# Altium footprint library Connector_Samtec_HLE_SMD.PcbLib: 290 footprints (part 23 of 24)
Each footprint in its own frame and in the unit in brackets; x right, y up, seen from the top. Pads: shape width x height; smd on the part's side, far side on the other; paste and mask are expansions set on the pad; w line width, h text height; cw(c..) or ccw(c..) is an arc to the next point about the centre after c.
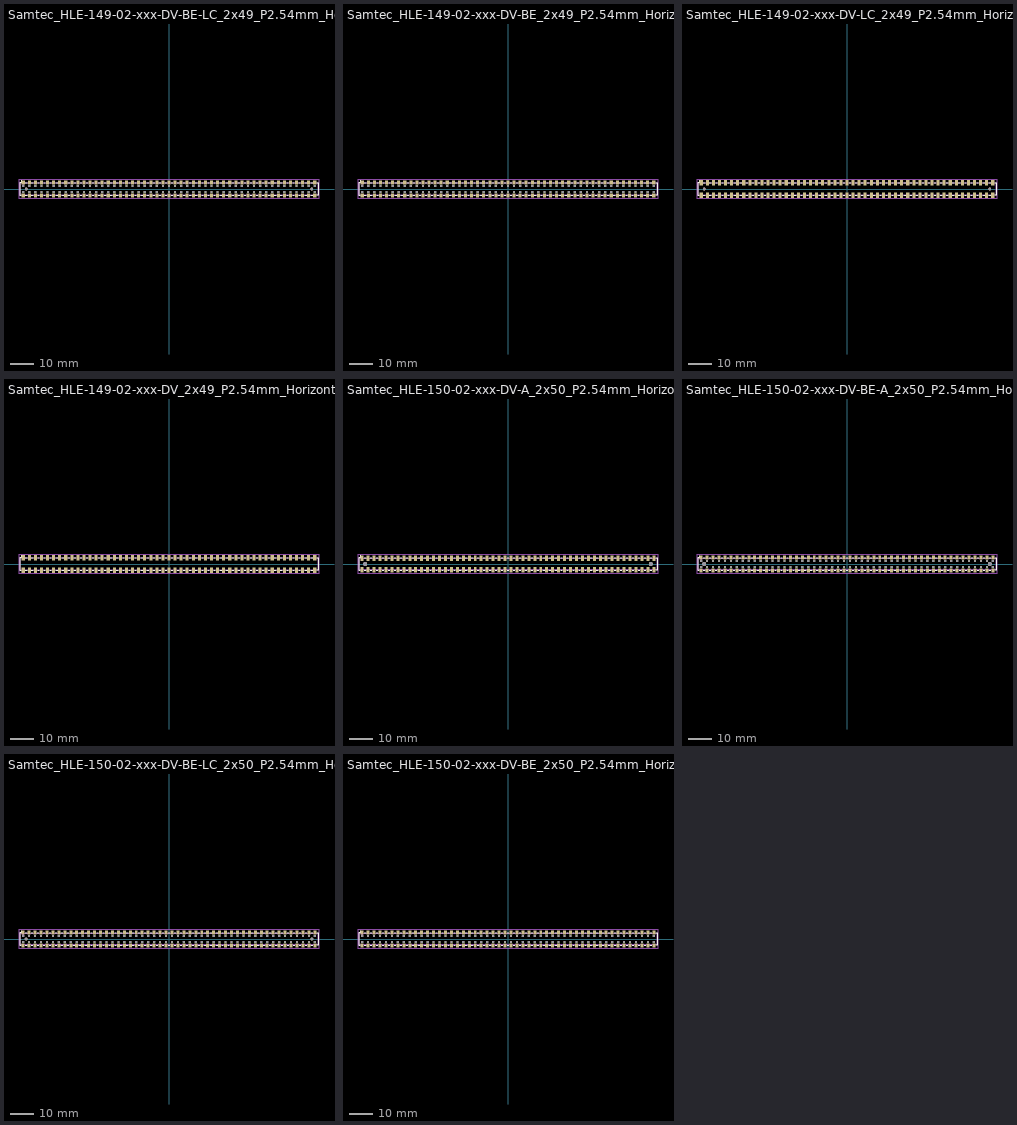
[diagram p22: the footprints below, top view; thin cyan lines are the x and y axes]

## Samtec_HLE-149-02-xxx-DV-BE-LC_2x49_P2.54mm_Horizontal [mm]
pads (198):
  rect 1.27x1.68 smd: 1(-60.96,2.72) 2(-60.96,-2.72) 3(-58.42,2.72) 4(-58.42,-2.72) 5(-55.88,2.72) 6(-55.88,-2.72) 7(-53.34,2.72) 8(-53.34,-2.72) 9(-50.8,2.72) 10(-50.8,-2.72) 11(-48.26,2.72) 12(-48.26,-2.72) 13(-45.72,2.72) 14(-45.72,-2.72) 15(-43.18,2.72) 16(-43.18,-2.72) 17(-40.64,2.72) 18(-40.64,-2.72) 19(-38.1,2.72) 20(-38.1,-2.72) 21(-35.56,2.72) 22(-35.56,-2.72) 23(-33.02,2.72) 24(-33.02,-2.72) 25(-30.48,2.72) 26(-30.48,-2.72) 27(-27.94,2.72) 28(-27.94,-2.72) 29(-25.4,2.72) 30(-25.4,-2.72) 31(-22.86,2.72) 32(-22.86,-2.72) 33(-20.32,2.72) 34(-20.32,-2.72) 35(-17.78,2.72) 36(-17.78,-2.72) 37(-15.24,2.72) 38(-15.24,-2.72) 39(-12.7,2.72) 40(-12.7,-2.72) 41(-10.16,2.72) 42(-10.16,-2.72) 43(-7.62,2.72) 44(-7.62,-2.72) 45(-5.08,2.72) 46(-5.08,-2.72) 47(-2.54,2.72) 48(-2.54,-2.72) 49(0,2.72) 50(0,-2.72) 51(2.54,2.72) 52(2.54,-2.72) 53(5.08,2.72) 54(5.08,-2.72) 55(7.62,2.72) 56(7.62,-2.72) 57(10.16,2.72) 58(10.16,-2.72) 59(12.7,2.72) 60(12.7,-2.72) 61(15.24,2.72) 62(15.24,-2.72) 63(17.78,2.72) 64(17.78,-2.72) 65(20.32,2.72) 66(20.32,-2.72) 67(22.86,2.72) 68(22.86,-2.72) 69(25.4,2.72) 70(25.4,-2.72) 71(27.94,2.72) 72(27.94,-2.72) 73(30.48,2.72) 74(30.48,-2.72) 75(33.02,2.72) 76(33.02,-2.72) 77(35.56,2.72) 78(35.56,-2.72) 79(38.1,2.72) 80(38.1,-2.72) 81(40.64,2.72) 82(40.64,-2.72) 83(43.18,2.72) 84(43.18,-2.72) 85(45.72,2.72) 86(45.72,-2.72) 87(48.26,2.72) 88(48.26,-2.72) 89(50.8,2.72) 90(50.8,-2.72) 91(53.34,2.72) 92(53.34,-2.72) 93(55.88,2.72) 94(55.88,-2.72) 95(58.42,2.72) 96(58.42,-2.72) 97(60.96,2.72) 98(60.96,-2.72)
  round 0.97 hole 0.97: Un1(0,1.27) Un2(17.78,-1.27) Un3(22.86,-1.27) Un4(-25.4,1.27) Un5(35.56,-1.27) Un6(-38.1,-1.27) Un7(-17.78,1.27) Un8(-35.56,1.27) Un9(38.1,1.27) Un10(40.64,1.27) Un11(30.48,-1.27) Un12(-15.24,-1.27) Un13(5.08,-1.27) Un14(10.16,1.27) Un15(7.62,1.27) Un16(-60.96,-1.27) Un17(-20.32,1.27) Un18(-10.16,-1.27) Un19(43.18,1.27) Un20(-10.16,1.27) Un21(45.72,-1.27) Un22(-45.72,-1.27) Un23(-40.64,-1.27) Un24(50.8,-1.27) Un25(-43.18,-1.27) Un26(-53.34,1.27) Un27(22.86,1.27) Un28(-7.62,1.27) Un29(58.42,1.27) Un30(-58.42,-1.27) Un31(-2.54,1.27) Un32(40.64,-1.27) Un33(-7.62,-1.27) Un34(-33.02,1.27) Un35(60.96,-1.27) Un36(-5.08,-1.27) Un37(-2.54,-1.27) Un38(-50.8,1.27) Un39(7.62,-1.27) Un40(-50.8,-1.27) Un41(-12.7,-1.27) Un42(-53.34,-1.27) Un43(33.02,-1.27) Un44(-55.88,-1.27) Un45(-55.88,1.27) Un46(-17.78,-1.27) Un47(-43.18,1.27) Un48(-22.86,-1.27) Un49(-20.32,-1.27) Un50(-40.64,1.27) Un51(53.34,-1.27) Un52(30.48,1.27) Un53(5.08,1.27) Un54(-45.72,1.27) Un55(20.32,1.27) Un56(0,-1.27) Un57(58.42,-1.27) Un58(-60.96,1.27) Un59(48.26,1.27) Un60(-30.48,-1.27) Un61(55.88,1.27) Un62(2.54,1.27) Un63(-48.26,1.27) Un64(2.54,-1.27) Un65(60.96,1.27) Un66(50.8,1.27) Un67(35.56,1.27) Un68(-58.42,1.27) Un69(17.78,1.27) Un70(55.88,-1.27) Un71(-38.1,1.27) Un72(-22.86,1.27) Un73(53.34,1.27) Un74(15.24,-1.27) Un76(15.24,1.27) Un78(-30.48,1.27) Un79(10.16,-1.27) Un80(27.94,1.27) Un81(20.32,-1.27) Un82(-33.02,-1.27) Un83(-27.94,1.27) Un84(43.18,-1.27) Un85(-48.26,-1.27) Un86(45.72,1.27) Un87(12.7,-1.27) Un88(-15.24,1.27) Un89(-25.4,-1.27) Un90(48.26,-1.27) Un91(-12.7,1.27) Un92(12.7,1.27) Un93(-35.56,-1.27) Un94(25.4,1.27) Un95(27.94,-1.27) Un96(25.4,-1.27) Un97(38.1,-1.27) Un98(-27.94,-1.27) Un99(-5.08,1.27) Un100(33.02,1.27)
  round 1.19 hole 1.19: Un75(-59.69,0) Un77(59.69,0)
F.SilkS:
  lines w0.12: -61.855,-2.65 -62.34,-2.65 -62.34,2.65 -61.855,2.65 -61.855,3.56 ; -60.065,-2.65 -59.315,-2.65 ; -60.065,2.65 -59.315,2.65 ; -57.525,-2.65 -56.775,-2.65 ; -57.525,2.65 -56.775,2.65 ; -54.985,-2.65 -54.235,-2.65 ; -54.985,2.65 -54.235,2.65 ; -52.445,-2.65 -51.695,-2.65 ; -52.445,2.65 -51.695,2.65 ; -49.905,-2.65 -49.155,-2.65 ; -49.905,2.65 -49.155,2.65 ; -47.365,-2.65 -46.615,-2.65 ; -47.365,2.65 -46.615,2.65 ; -44.825,-2.65 -44.075,-2.65 ; -44.825,2.65 -44.075,2.65 ; -42.285,-2.65 -41.535,-2.65 ; -42.285,2.65 -41.535,2.65 ; -39.745,-2.65 -38.995,-2.65 ; -39.745,2.65 -38.995,2.65 ; -37.205,-2.65 -36.455,-2.65 ; -37.205,2.65 -36.455,2.65 ; -34.665,-2.65 -33.915,-2.65 ; -34.665,2.65 -33.915,2.65 ; -32.125,-2.65 -31.375,-2.65 ; -32.125,2.65 -31.375,2.65 ; -29.585,-2.65 -28.835,-2.65 ; -29.585,2.65 -28.835,2.65 ; -27.045,-2.65 -26.295,-2.65 ; -27.045,2.65 -26.295,2.65 ; -24.505,-2.65 -23.755,-2.65 ; -24.505,2.65 -23.755,2.65 ; -21.965,-2.65 -21.215,-2.65 ; -21.965,2.65 -21.215,2.65 ; -19.425,-2.65 -18.675,-2.65 ; -19.425,2.65 -18.675,2.65 ; -16.885,-2.65 -16.135,-2.65 ; -16.885,2.65 -16.135,2.65 ; -14.345,-2.65 -13.595,-2.65 ; -14.345,2.65 -13.595,2.65 ; -11.805,-2.65 -11.055,-2.65 ; -11.805,2.65 -11.055,2.65 ; -9.265,-2.65 -8.515,-2.65 ; -9.265,2.65 -8.515,2.65 ; -6.725,-2.65 -5.975,-2.65 ; -6.725,2.65 -5.975,2.65 ; -4.185,-2.65 -3.435,-2.65 ; -4.185,2.65 -3.435,2.65 ; -1.645,-2.65 -0.895,-2.65 ; -1.645,2.65 -0.895,2.65 ; 0.895,-2.65 1.645,-2.65 ; 0.895,2.65 1.645,2.65 ; 3.435,-2.65 4.185,-2.65 ; 3.435,2.65 4.185,2.65 ; 5.975,-2.65 6.725,-2.65 ; 5.975,2.65 6.725,2.65 ; 8.515,-2.65 9.265,-2.65 ; 8.515,2.65 9.265,2.65 ; 11.055,-2.65 11.805,-2.65 ; 11.055,2.65 11.805,2.65 ; 13.595,-2.65 14.345,-2.65 ; 13.595,2.65 14.345,2.65 ; 16.135,-2.65 16.885,-2.65 ; 16.135,2.65 16.885,2.65 ; 18.675,-2.65 19.425,-2.65 ; 18.675,2.65 19.425,2.65 ; 21.215,-2.65 21.965,-2.65 ; 21.215,2.65 21.965,2.65 ; 23.755,-2.65 24.505,-2.65 ; 23.755,2.65 24.505,2.65 ; 26.295,-2.65 27.045,-2.65 ; 26.295,2.65 27.045,2.65 ; 28.835,-2.65 29.585,-2.65 ; 28.835,2.65 29.585,2.65 ; 31.375,-2.65 32.125,-2.65 ; 31.375,2.65 32.125,2.65 ; 33.915,-2.65 34.665,-2.65 ; 33.915,2.65 34.665,2.65 ; 36.455,-2.65 37.205,-2.65 ; 36.455,2.65 37.205,2.65 ; 38.995,-2.65 39.745,-2.65 ; 38.995,2.65 39.745,2.65 ; 41.535,-2.65 42.285,-2.65 ; 41.535,2.65 42.285,2.65 ; 44.075,-2.65 44.825,-2.65 ; 44.075,2.65 44.825,2.65 ; 46.615,-2.65 47.365,-2.65 ; 46.615,2.65 47.365,2.65 ; 49.155,-2.65 49.905,-2.65 ; 49.155,2.65 49.905,2.65 ; 51.695,-2.65 52.445,-2.65 ; 51.695,2.65 52.445,2.65 ; 54.235,-2.65 54.985,-2.65 ; 54.235,2.65 54.985,2.65 ; 56.775,-2.65 57.525,-2.65 ; 56.775,2.65 57.525,2.65 ; 59.315,-2.65 60.065,-2.65 ; 59.315,2.65 60.065,2.65 ; 61.855,-2.65 62.34,-2.65 62.34,2.65 61.855,2.65
F.CrtYd:
  lines w0.05: -62.73,-4.06 -62.73,4.06 62.73,4.06 62.73,-4.06 -62.73,-4.06
F.Fab:
  lines w0.1: -61.46,2.54 -60.96,1.833 -60.46,2.54 ; -62.23,-2.54 -62.23,2.54 62.23,2.54 62.23,-2.54 -62.23,-2.54
  text "'.Designator'" at -4.047,-2.68 h1

## Samtec_HLE-149-02-xxx-DV-BE_2x49_P2.54mm_Horizontal [mm]
pads (196):
  rect 1.27x1.68 smd: 1(-60.96,2.72) 2(-60.96,-2.72) 3(-58.42,2.72) 4(-58.42,-2.72) 5(-55.88,2.72) 6(-55.88,-2.72) 7(-53.34,2.72) 8(-53.34,-2.72) 9(-50.8,2.72) 10(-50.8,-2.72) 11(-48.26,2.72) 12(-48.26,-2.72) 13(-45.72,2.72) 14(-45.72,-2.72) 15(-43.18,2.72) 16(-43.18,-2.72) 17(-40.64,2.72) 18(-40.64,-2.72) 19(-38.1,2.72) 20(-38.1,-2.72) 21(-35.56,2.72) 22(-35.56,-2.72) 23(-33.02,2.72) 24(-33.02,-2.72) 25(-30.48,2.72) 26(-30.48,-2.72) 27(-27.94,2.72) 28(-27.94,-2.72) 29(-25.4,2.72) 30(-25.4,-2.72) 31(-22.86,2.72) 32(-22.86,-2.72) 33(-20.32,2.72) 34(-20.32,-2.72) 35(-17.78,2.72) 36(-17.78,-2.72) 37(-15.24,2.72) 38(-15.24,-2.72) 39(-12.7,2.72) 40(-12.7,-2.72) 41(-10.16,2.72) 42(-10.16,-2.72) 43(-7.62,2.72) 44(-7.62,-2.72) 45(-5.08,2.72) 46(-5.08,-2.72) 47(-2.54,2.72) 48(-2.54,-2.72) 49(0,2.72) 50(0,-2.72) 51(2.54,2.72) 52(2.54,-2.72) 53(5.08,2.72) 54(5.08,-2.72) 55(7.62,2.72) 56(7.62,-2.72) 57(10.16,2.72) 58(10.16,-2.72) 59(12.7,2.72) 60(12.7,-2.72) 61(15.24,2.72) 62(15.24,-2.72) 63(17.78,2.72) 64(17.78,-2.72) 65(20.32,2.72) 66(20.32,-2.72) 67(22.86,2.72) 68(22.86,-2.72) 69(25.4,2.72) 70(25.4,-2.72) 71(27.94,2.72) 72(27.94,-2.72) 73(30.48,2.72) 74(30.48,-2.72) 75(33.02,2.72) 76(33.02,-2.72) 77(35.56,2.72) 78(35.56,-2.72) 79(38.1,2.72) 80(38.1,-2.72) 81(40.64,2.72) 82(40.64,-2.72) 83(43.18,2.72) 84(43.18,-2.72) 85(45.72,2.72) 86(45.72,-2.72) 87(48.26,2.72) 88(48.26,-2.72) 89(50.8,2.72) 90(50.8,-2.72) 91(53.34,2.72) 92(53.34,-2.72) 93(55.88,2.72) 94(55.88,-2.72) 95(58.42,2.72) 96(58.42,-2.72) 97(60.96,2.72) 98(60.96,-2.72)
  round 0.97 hole 0.97: Un1(12.7,1.27) Un2(0,-1.27) Un3(22.86,-1.27) Un4(-38.1,-1.27) Un5(7.62,-1.27) Un6(-60.96,1.27) Un7(27.94,1.27) Un8(-30.48,1.27) Un9(-53.34,-1.27) Un10(-55.88,-1.27) Un11(55.88,-1.27) Un12(45.72,1.27) Un13(-43.18,-1.27) Un14(-33.02,1.27) Un15(38.1,-1.27) Un16(15.24,1.27) Un17(43.18,-1.27) Un18(-60.96,-1.27) Un19(58.42,1.27) Un20(-17.78,-1.27) Un21(-40.64,1.27) Un22(48.26,-1.27) Un23(17.78,-1.27) Un24(27.94,-1.27) Un25(-17.78,1.27) Un26(-22.86,1.27) Un27(-27.94,-1.27) Un28(40.64,-1.27) Un29(33.02,1.27) Un30(-7.62,-1.27) Un31(10.16,1.27) Un32(45.72,-1.27) Un33(58.42,-1.27) Un34(-10.16,-1.27) Un35(60.96,1.27) Un36(40.64,1.27) Un37(-25.4,1.27) Un38(15.24,-1.27) Un39(-15.24,-1.27) Un40(25.4,1.27) Un41(-5.08,1.27) Un42(-7.62,1.27) Un43(5.08,-1.27) Un44(17.78,1.27) Un45(43.18,1.27) Un46(30.48,-1.27) Un47(-2.54,1.27) Un48(-43.18,1.27) Un49(12.7,-1.27) Un50(55.88,1.27) Un51(2.54,1.27) Un52(-2.54,-1.27) Un53(53.34,-1.27) Un54(-20.32,1.27) Un55(-38.1,1.27) Un56(50.8,-1.27) Un57(-20.32,-1.27) Un58(-35.56,1.27) Un59(-58.42,1.27) Un60(-55.88,1.27) Un61(-15.24,1.27) Un62(53.34,1.27) Un63(2.54,-1.27) Un64(-22.86,-1.27) Un65(-27.94,1.27) Un66(38.1,1.27) Un67(33.02,-1.27) Un68(-45.72,1.27) Un69(-40.64,-1.27) Un70(-30.48,-1.27) Un71(-48.26,1.27) Un72(-45.72,-1.27) Un73(20.32,-1.27) Un74(35.56,1.27) Un75(5.08,1.27) Un76(22.86,1.27) Un77(0,1.27) Un78(-58.42,-1.27) Un79(-48.26,-1.27) Un80(60.96,-1.27) Un81(50.8,1.27) Un82(-50.8,1.27) Un83(30.48,1.27) Un84(-5.08,-1.27) Un85(-50.8,-1.27) Un86(48.26,1.27) Un87(-35.56,-1.27) Un88(-33.02,-1.27) Un89(20.32,1.27) Un90(7.62,1.27) Un91(10.16,-1.27) Un92(-10.16,1.27) Un93(-53.34,1.27) Un94(25.4,-1.27) Un95(35.56,-1.27) Un96(-12.7,1.27) Un97(-12.7,-1.27) Un98(-25.4,-1.27)
F.SilkS:
  lines w0.12: -61.855,-2.65 -62.34,-2.65 -62.34,2.65 -61.855,2.65 -61.855,3.56 ; -60.065,-2.65 -59.315,-2.65 ; -60.065,2.65 -59.315,2.65 ; -57.525,-2.65 -56.775,-2.65 ; -57.525,2.65 -56.775,2.65 ; -54.985,-2.65 -54.235,-2.65 ; -54.985,2.65 -54.235,2.65 ; -52.445,-2.65 -51.695,-2.65 ; -52.445,2.65 -51.695,2.65 ; -49.905,-2.65 -49.155,-2.65 ; -49.905,2.65 -49.155,2.65 ; -47.365,-2.65 -46.615,-2.65 ; -47.365,2.65 -46.615,2.65 ; -44.825,-2.65 -44.075,-2.65 ; -44.825,2.65 -44.075,2.65 ; -42.285,-2.65 -41.535,-2.65 ; -42.285,2.65 -41.535,2.65 ; -39.745,-2.65 -38.995,-2.65 ; -39.745,2.65 -38.995,2.65 ; -37.205,-2.65 -36.455,-2.65 ; -37.205,2.65 -36.455,2.65 ; -34.665,-2.65 -33.915,-2.65 ; -34.665,2.65 -33.915,2.65 ; -32.125,-2.65 -31.375,-2.65 ; -32.125,2.65 -31.375,2.65 ; -29.585,-2.65 -28.835,-2.65 ; -29.585,2.65 -28.835,2.65 ; -27.045,-2.65 -26.295,-2.65 ; -27.045,2.65 -26.295,2.65 ; -24.505,-2.65 -23.755,-2.65 ; -24.505,2.65 -23.755,2.65 ; -21.965,-2.65 -21.215,-2.65 ; -21.965,2.65 -21.215,2.65 ; -19.425,-2.65 -18.675,-2.65 ; -19.425,2.65 -18.675,2.65 ; -16.885,-2.65 -16.135,-2.65 ; -16.885,2.65 -16.135,2.65 ; -14.345,-2.65 -13.595,-2.65 ; -14.345,2.65 -13.595,2.65 ; -11.805,-2.65 -11.055,-2.65 ; -11.805,2.65 -11.055,2.65 ; -9.265,-2.65 -8.515,-2.65 ; -9.265,2.65 -8.515,2.65 ; -6.725,-2.65 -5.975,-2.65 ; -6.725,2.65 -5.975,2.65 ; -4.185,-2.65 -3.435,-2.65 ; -4.185,2.65 -3.435,2.65 ; -1.645,-2.65 -0.895,-2.65 ; -1.645,2.65 -0.895,2.65 ; 0.895,-2.65 1.645,-2.65 ; 0.895,2.65 1.645,2.65 ; 3.435,-2.65 4.185,-2.65 ; 3.435,2.65 4.185,2.65 ; 5.975,-2.65 6.725,-2.65 ; 5.975,2.65 6.725,2.65 ; 8.515,-2.65 9.265,-2.65 ; 8.515,2.65 9.265,2.65 ; 11.055,-2.65 11.805,-2.65 ; 11.055,2.65 11.805,2.65 ; 13.595,-2.65 14.345,-2.65 ; 13.595,2.65 14.345,2.65 ; 16.135,-2.65 16.885,-2.65 ; 16.135,2.65 16.885,2.65 ; 18.675,-2.65 19.425,-2.65 ; 18.675,2.65 19.425,2.65 ; 21.215,-2.65 21.965,-2.65 ; 21.215,2.65 21.965,2.65 ; 23.755,-2.65 24.505,-2.65 ; 23.755,2.65 24.505,2.65 ; 26.295,-2.65 27.045,-2.65 ; 26.295,2.65 27.045,2.65 ; 28.835,-2.65 29.585,-2.65 ; 28.835,2.65 29.585,2.65 ; 31.375,-2.65 32.125,-2.65 ; 31.375,2.65 32.125,2.65 ; 33.915,-2.65 34.665,-2.65 ; 33.915,2.65 34.665,2.65 ; 36.455,-2.65 37.205,-2.65 ; 36.455,2.65 37.205,2.65 ; 38.995,-2.65 39.745,-2.65 ; 38.995,2.65 39.745,2.65 ; 41.535,-2.65 42.285,-2.65 ; 41.535,2.65 42.285,2.65 ; 44.075,-2.65 44.825,-2.65 ; 44.075,2.65 44.825,2.65 ; 46.615,-2.65 47.365,-2.65 ; 46.615,2.65 47.365,2.65 ; 49.155,-2.65 49.905,-2.65 ; 49.155,2.65 49.905,2.65 ; 51.695,-2.65 52.445,-2.65 ; 51.695,2.65 52.445,2.65 ; 54.235,-2.65 54.985,-2.65 ; 54.235,2.65 54.985,2.65 ; 56.775,-2.65 57.525,-2.65 ; 56.775,2.65 57.525,2.65 ; 59.315,-2.65 60.065,-2.65 ; 59.315,2.65 60.065,2.65 ; 61.855,-2.65 62.34,-2.65 62.34,2.65 61.855,2.65
F.CrtYd:
  lines w0.05: -62.73,-4.06 -62.73,4.06 62.73,4.06 62.73,-4.06 -62.73,-4.06
F.Fab:
  lines w0.1: -61.46,2.54 -60.96,1.833 -60.46,2.54 ; -62.23,-2.54 -62.23,2.54 62.23,2.54 62.23,-2.54 -62.23,-2.54
  text "'.Designator'" at -4.047,-2.68 h1

## Samtec_HLE-149-02-xxx-DV-LC_2x49_P2.54mm_Horizontal [mm]
pads (100):
  rect 1.27x2.29 smd: 1(-60.96,2.525) 2(-60.96,-2.525) 3(-58.42,2.525) 4(-58.42,-2.525) 5(-55.88,2.525) 6(-55.88,-2.525) 7(-53.34,2.525) 8(-53.34,-2.525) 9(-50.8,2.525) 10(-50.8,-2.525) 11(-48.26,2.525) 12(-48.26,-2.525) 13(-45.72,2.525) 14(-45.72,-2.525) 15(-43.18,2.525) 16(-43.18,-2.525) 17(-40.64,2.525) 18(-40.64,-2.525) 19(-38.1,2.525) 20(-38.1,-2.525) 21(-35.56,2.525) 22(-35.56,-2.525) 23(-33.02,2.525) 24(-33.02,-2.525) 25(-30.48,2.525) 26(-30.48,-2.525) 27(-27.94,2.525) 28(-27.94,-2.525) 29(-25.4,2.525) 30(-25.4,-2.525) 31(-22.86,2.525) 32(-22.86,-2.525) 33(-20.32,2.525) 34(-20.32,-2.525) 35(-17.78,2.525) 36(-17.78,-2.525) 37(-15.24,2.525) 38(-15.24,-2.525) 39(-12.7,2.525) 40(-12.7,-2.525) 41(-10.16,2.525) 42(-10.16,-2.525) 43(-7.62,2.525) 44(-7.62,-2.525) 45(-5.08,2.525) 46(-5.08,-2.525) 47(-2.54,2.525) 48(-2.54,-2.525) 49(0,2.525) 50(0,-2.525) 51(2.54,2.525) 52(2.54,-2.525) 53(5.08,2.525) 54(5.08,-2.525) 55(7.62,2.525) 56(7.62,-2.525) 57(10.16,2.525) 58(10.16,-2.525) 59(12.7,2.525) 60(12.7,-2.525) 61(15.24,2.525) 62(15.24,-2.525) 63(17.78,2.525) 64(17.78,-2.525) 65(20.32,2.525) 66(20.32,-2.525) 67(22.86,2.525) 68(22.86,-2.525) 69(25.4,2.525) 70(25.4,-2.525) 71(27.94,2.525) 72(27.94,-2.525) 73(30.48,2.525) 74(30.48,-2.525) 75(33.02,2.525) 76(33.02,-2.525) 77(35.56,2.525) 78(35.56,-2.525) 79(38.1,2.525) 80(38.1,-2.525) 81(40.64,2.525) 82(40.64,-2.525) 83(43.18,2.525) 84(43.18,-2.525) 85(45.72,2.525) 86(45.72,-2.525) 87(48.26,2.525) 88(48.26,-2.525) 89(50.8,2.525) 90(50.8,-2.525) 91(53.34,2.525) 92(53.34,-2.525) 93(55.88,2.525) 94(55.88,-2.525) 95(58.42,2.525) 96(58.42,-2.525) 97(60.96,2.525) 98(60.96,-2.525)
  round 1.19 hole 1.19: Un1(59.69,0) Un2(-59.69,0)
F.SilkS:
  lines w0.12: -61.855,-2.65 -62.34,-2.65 -62.34,2.65 -61.855,2.65 -61.855,3.67 ; -60.065,-2.65 -59.315,-2.65 ; -60.065,2.65 -59.315,2.65 ; -57.525,-2.65 -56.775,-2.65 ; -57.525,2.65 -56.775,2.65 ; -54.985,-2.65 -54.235,-2.65 ; -54.985,2.65 -54.235,2.65 ; -52.445,-2.65 -51.695,-2.65 ; -52.445,2.65 -51.695,2.65 ; -49.905,-2.65 -49.155,-2.65 ; -49.905,2.65 -49.155,2.65 ; -47.365,-2.65 -46.615,-2.65 ; -47.365,2.65 -46.615,2.65 ; -44.825,-2.65 -44.075,-2.65 ; -44.825,2.65 -44.075,2.65 ; -42.285,-2.65 -41.535,-2.65 ; -42.285,2.65 -41.535,2.65 ; -39.745,-2.65 -38.995,-2.65 ; -39.745,2.65 -38.995,2.65 ; -37.205,-2.65 -36.455,-2.65 ; -37.205,2.65 -36.455,2.65 ; -34.665,-2.65 -33.915,-2.65 ; -34.665,2.65 -33.915,2.65 ; -32.125,-2.65 -31.375,-2.65 ; -32.125,2.65 -31.375,2.65 ; -29.585,-2.65 -28.835,-2.65 ; -29.585,2.65 -28.835,2.65 ; -27.045,-2.65 -26.295,-2.65 ; -27.045,2.65 -26.295,2.65 ; -24.505,-2.65 -23.755,-2.65 ; -24.505,2.65 -23.755,2.65 ; -21.965,-2.65 -21.215,-2.65 ; -21.965,2.65 -21.215,2.65 ; -19.425,-2.65 -18.675,-2.65 ; -19.425,2.65 -18.675,2.65 ; -16.885,-2.65 -16.135,-2.65 ; -16.885,2.65 -16.135,2.65 ; -14.345,-2.65 -13.595,-2.65 ; -14.345,2.65 -13.595,2.65 ; -11.805,-2.65 -11.055,-2.65 ; -11.805,2.65 -11.055,2.65 ; -9.265,-2.65 -8.515,-2.65 ; -9.265,2.65 -8.515,2.65 ; -6.725,-2.65 -5.975,-2.65 ; -6.725,2.65 -5.975,2.65 ; -4.185,-2.65 -3.435,-2.65 ; -4.185,2.65 -3.435,2.65 ; -1.645,-2.65 -0.895,-2.65 ; -1.645,2.65 -0.895,2.65 ; 0.895,-2.65 1.645,-2.65 ; 0.895,2.65 1.645,2.65 ; 3.435,-2.65 4.185,-2.65 ; 3.435,2.65 4.185,2.65 ; 5.975,-2.65 6.725,-2.65 ; 5.975,2.65 6.725,2.65 ; 8.515,-2.65 9.265,-2.65 ; 8.515,2.65 9.265,2.65 ; 11.055,-2.65 11.805,-2.65 ; 11.055,2.65 11.805,2.65 ; 13.595,-2.65 14.345,-2.65 ; 13.595,2.65 14.345,2.65 ; 16.135,-2.65 16.885,-2.65 ; 16.135,2.65 16.885,2.65 ; 18.675,-2.65 19.425,-2.65 ; 18.675,2.65 19.425,2.65 ; 21.215,-2.65 21.965,-2.65 ; 21.215,2.65 21.965,2.65 ; 23.755,-2.65 24.505,-2.65 ; 23.755,2.65 24.505,2.65 ; 26.295,-2.65 27.045,-2.65 ; 26.295,2.65 27.045,2.65 ; 28.835,-2.65 29.585,-2.65 ; 28.835,2.65 29.585,2.65 ; 31.375,-2.65 32.125,-2.65 ; 31.375,2.65 32.125,2.65 ; 33.915,-2.65 34.665,-2.65 ; 33.915,2.65 34.665,2.65 ; 36.455,-2.65 37.205,-2.65 ; 36.455,2.65 37.205,2.65 ; 38.995,-2.65 39.745,-2.65 ; 38.995,2.65 39.745,2.65 ; 41.535,-2.65 42.285,-2.65 ; 41.535,2.65 42.285,2.65 ; 44.075,-2.65 44.825,-2.65 ; 44.075,2.65 44.825,2.65 ; 46.615,-2.65 47.365,-2.65 ; 46.615,2.65 47.365,2.65 ; 49.155,-2.65 49.905,-2.65 ; 49.155,2.65 49.905,2.65 ; 51.695,-2.65 52.445,-2.65 ; 51.695,2.65 52.445,2.65 ; 54.235,-2.65 54.985,-2.65 ; 54.235,2.65 54.985,2.65 ; 56.775,-2.65 57.525,-2.65 ; 56.775,2.65 57.525,2.65 ; 59.315,-2.65 60.065,-2.65 ; 59.315,2.65 60.065,2.65 ; 61.855,-2.65 62.34,-2.65 62.34,2.65 61.855,2.65
F.CrtYd:
  lines w0.05: -62.73,-4.17 -62.73,4.17 62.73,4.17 62.73,-4.17 -62.73,-4.17
F.Fab:
  lines w0.1: -61.46,2.54 -60.96,1.833 -60.46,2.54 ; -62.23,-2.54 -62.23,2.54 62.23,2.54 62.23,-2.54 -62.23,-2.54
  text "'.Designator'" at -4.047,-2.68 h1

## Samtec_HLE-149-02-xxx-DV_2x49_P2.54mm_Horizontal [mm]
pads (98):
  rect 1.27x2.29 smd: 1(-60.96,2.525) 2(-60.96,-2.525) 3(-58.42,2.525) 4(-58.42,-2.525) 5(-55.88,2.525) 6(-55.88,-2.525) 7(-53.34,2.525) 8(-53.34,-2.525) 9(-50.8,2.525) 10(-50.8,-2.525) 11(-48.26,2.525) 12(-48.26,-2.525) 13(-45.72,2.525) 14(-45.72,-2.525) 15(-43.18,2.525) 16(-43.18,-2.525) 17(-40.64,2.525) 18(-40.64,-2.525) 19(-38.1,2.525) 20(-38.1,-2.525) 21(-35.56,2.525) 22(-35.56,-2.525) 23(-33.02,2.525) 24(-33.02,-2.525) 25(-30.48,2.525) 26(-30.48,-2.525) 27(-27.94,2.525) 28(-27.94,-2.525) 29(-25.4,2.525) 30(-25.4,-2.525) 31(-22.86,2.525) 32(-22.86,-2.525) 33(-20.32,2.525) 34(-20.32,-2.525) 35(-17.78,2.525) 36(-17.78,-2.525) 37(-15.24,2.525) 38(-15.24,-2.525) 39(-12.7,2.525) 40(-12.7,-2.525) 41(-10.16,2.525) 42(-10.16,-2.525) 43(-7.62,2.525) 44(-7.62,-2.525) 45(-5.08,2.525) 46(-5.08,-2.525) 47(-2.54,2.525) 48(-2.54,-2.525) 49(0,2.525) 50(0,-2.525) 51(2.54,2.525) 52(2.54,-2.525) 53(5.08,2.525) 54(5.08,-2.525) 55(7.62,2.525) 56(7.62,-2.525) 57(10.16,2.525) 58(10.16,-2.525) 59(12.7,2.525) 60(12.7,-2.525) 61(15.24,2.525) 62(15.24,-2.525) 63(17.78,2.525) 64(17.78,-2.525) 65(20.32,2.525) 66(20.32,-2.525) 67(22.86,2.525) 68(22.86,-2.525) 69(25.4,2.525) 70(25.4,-2.525) 71(27.94,2.525) 72(27.94,-2.525) 73(30.48,2.525) 74(30.48,-2.525) 75(33.02,2.525) 76(33.02,-2.525) 77(35.56,2.525) 78(35.56,-2.525) 79(38.1,2.525) 80(38.1,-2.525) 81(40.64,2.525) 82(40.64,-2.525) 83(43.18,2.525) 84(43.18,-2.525) 85(45.72,2.525) 86(45.72,-2.525) 87(48.26,2.525) 88(48.26,-2.525) 89(50.8,2.525) 90(50.8,-2.525) 91(53.34,2.525) 92(53.34,-2.525) 93(55.88,2.525) 94(55.88,-2.525) 95(58.42,2.525) 96(58.42,-2.525) 97(60.96,2.525) 98(60.96,-2.525)
F.SilkS:
  lines w0.12: -61.855,-2.65 -62.34,-2.65 -62.34,2.65 -61.855,2.65 -61.855,3.67 ; -60.065,-2.65 -59.315,-2.65 ; -60.065,2.65 -59.315,2.65 ; -57.525,-2.65 -56.775,-2.65 ; -57.525,2.65 -56.775,2.65 ; -54.985,-2.65 -54.235,-2.65 ; -54.985,2.65 -54.235,2.65 ; -52.445,-2.65 -51.695,-2.65 ; -52.445,2.65 -51.695,2.65 ; -49.905,-2.65 -49.155,-2.65 ; -49.905,2.65 -49.155,2.65 ; -47.365,-2.65 -46.615,-2.65 ; -47.365,2.65 -46.615,2.65 ; -44.825,-2.65 -44.075,-2.65 ; -44.825,2.65 -44.075,2.65 ; -42.285,-2.65 -41.535,-2.65 ; -42.285,2.65 -41.535,2.65 ; -39.745,-2.65 -38.995,-2.65 ; -39.745,2.65 -38.995,2.65 ; -37.205,-2.65 -36.455,-2.65 ; -37.205,2.65 -36.455,2.65 ; -34.665,-2.65 -33.915,-2.65 ; -34.665,2.65 -33.915,2.65 ; -32.125,-2.65 -31.375,-2.65 ; -32.125,2.65 -31.375,2.65 ; -29.585,-2.65 -28.835,-2.65 ; -29.585,2.65 -28.835,2.65 ; -27.045,-2.65 -26.295,-2.65 ; -27.045,2.65 -26.295,2.65 ; -24.505,-2.65 -23.755,-2.65 ; -24.505,2.65 -23.755,2.65 ; -21.965,-2.65 -21.215,-2.65 ; -21.965,2.65 -21.215,2.65 ; -19.425,-2.65 -18.675,-2.65 ; -19.425,2.65 -18.675,2.65 ; -16.885,-2.65 -16.135,-2.65 ; -16.885,2.65 -16.135,2.65 ; -14.345,-2.65 -13.595,-2.65 ; -14.345,2.65 -13.595,2.65 ; -11.805,-2.65 -11.055,-2.65 ; -11.805,2.65 -11.055,2.65 ; -9.265,-2.65 -8.515,-2.65 ; -9.265,2.65 -8.515,2.65 ; -6.725,-2.65 -5.975,-2.65 ; -6.725,2.65 -5.975,2.65 ; -4.185,-2.65 -3.435,-2.65 ; -4.185,2.65 -3.435,2.65 ; -1.645,-2.65 -0.895,-2.65 ; -1.645,2.65 -0.895,2.65 ; 0.895,-2.65 1.645,-2.65 ; 0.895,2.65 1.645,2.65 ; 3.435,-2.65 4.185,-2.65 ; 3.435,2.65 4.185,2.65 ; 5.975,-2.65 6.725,-2.65 ; 5.975,2.65 6.725,2.65 ; 8.515,-2.65 9.265,-2.65 ; 8.515,2.65 9.265,2.65 ; 11.055,-2.65 11.805,-2.65 ; 11.055,2.65 11.805,2.65 ; 13.595,-2.65 14.345,-2.65 ; 13.595,2.65 14.345,2.65 ; 16.135,-2.65 16.885,-2.65 ; 16.135,2.65 16.885,2.65 ; 18.675,-2.65 19.425,-2.65 ; 18.675,2.65 19.425,2.65 ; 21.215,-2.65 21.965,-2.65 ; 21.215,2.65 21.965,2.65 ; 23.755,-2.65 24.505,-2.65 ; 23.755,2.65 24.505,2.65 ; 26.295,-2.65 27.045,-2.65 ; 26.295,2.65 27.045,2.65 ; 28.835,-2.65 29.585,-2.65 ; 28.835,2.65 29.585,2.65 ; 31.375,-2.65 32.125,-2.65 ; 31.375,2.65 32.125,2.65 ; 33.915,-2.65 34.665,-2.65 ; 33.915,2.65 34.665,2.65 ; 36.455,-2.65 37.205,-2.65 ; 36.455,2.65 37.205,2.65 ; 38.995,-2.65 39.745,-2.65 ; 38.995,2.65 39.745,2.65 ; 41.535,-2.65 42.285,-2.65 ; 41.535,2.65 42.285,2.65 ; 44.075,-2.65 44.825,-2.65 ; 44.075,2.65 44.825,2.65 ; 46.615,-2.65 47.365,-2.65 ; 46.615,2.65 47.365,2.65 ; 49.155,-2.65 49.905,-2.65 ; 49.155,2.65 49.905,2.65 ; 51.695,-2.65 52.445,-2.65 ; 51.695,2.65 52.445,2.65 ; 54.235,-2.65 54.985,-2.65 ; 54.235,2.65 54.985,2.65 ; 56.775,-2.65 57.525,-2.65 ; 56.775,2.65 57.525,2.65 ; 59.315,-2.65 60.065,-2.65 ; 59.315,2.65 60.065,2.65 ; 61.855,-2.65 62.34,-2.65 62.34,2.65 61.855,2.65
F.CrtYd:
  lines w0.05: -62.73,-4.17 -62.73,4.17 62.73,4.17 62.73,-4.17 -62.73,-4.17
F.Fab: